# Altium footprint library Horizont_11_12_2017.PcbLib: 257 footprints (part 12 of 17)
Each footprint in its own frame and in the unit in brackets; x right, y up, seen from the top. Pads: shape width x height; smd on the part's side, far side on the other; paste and mask are expansions set on the pad; w line width, h text height; cw(c..) or ccw(c..) is an arc to the next point about the centre after c.
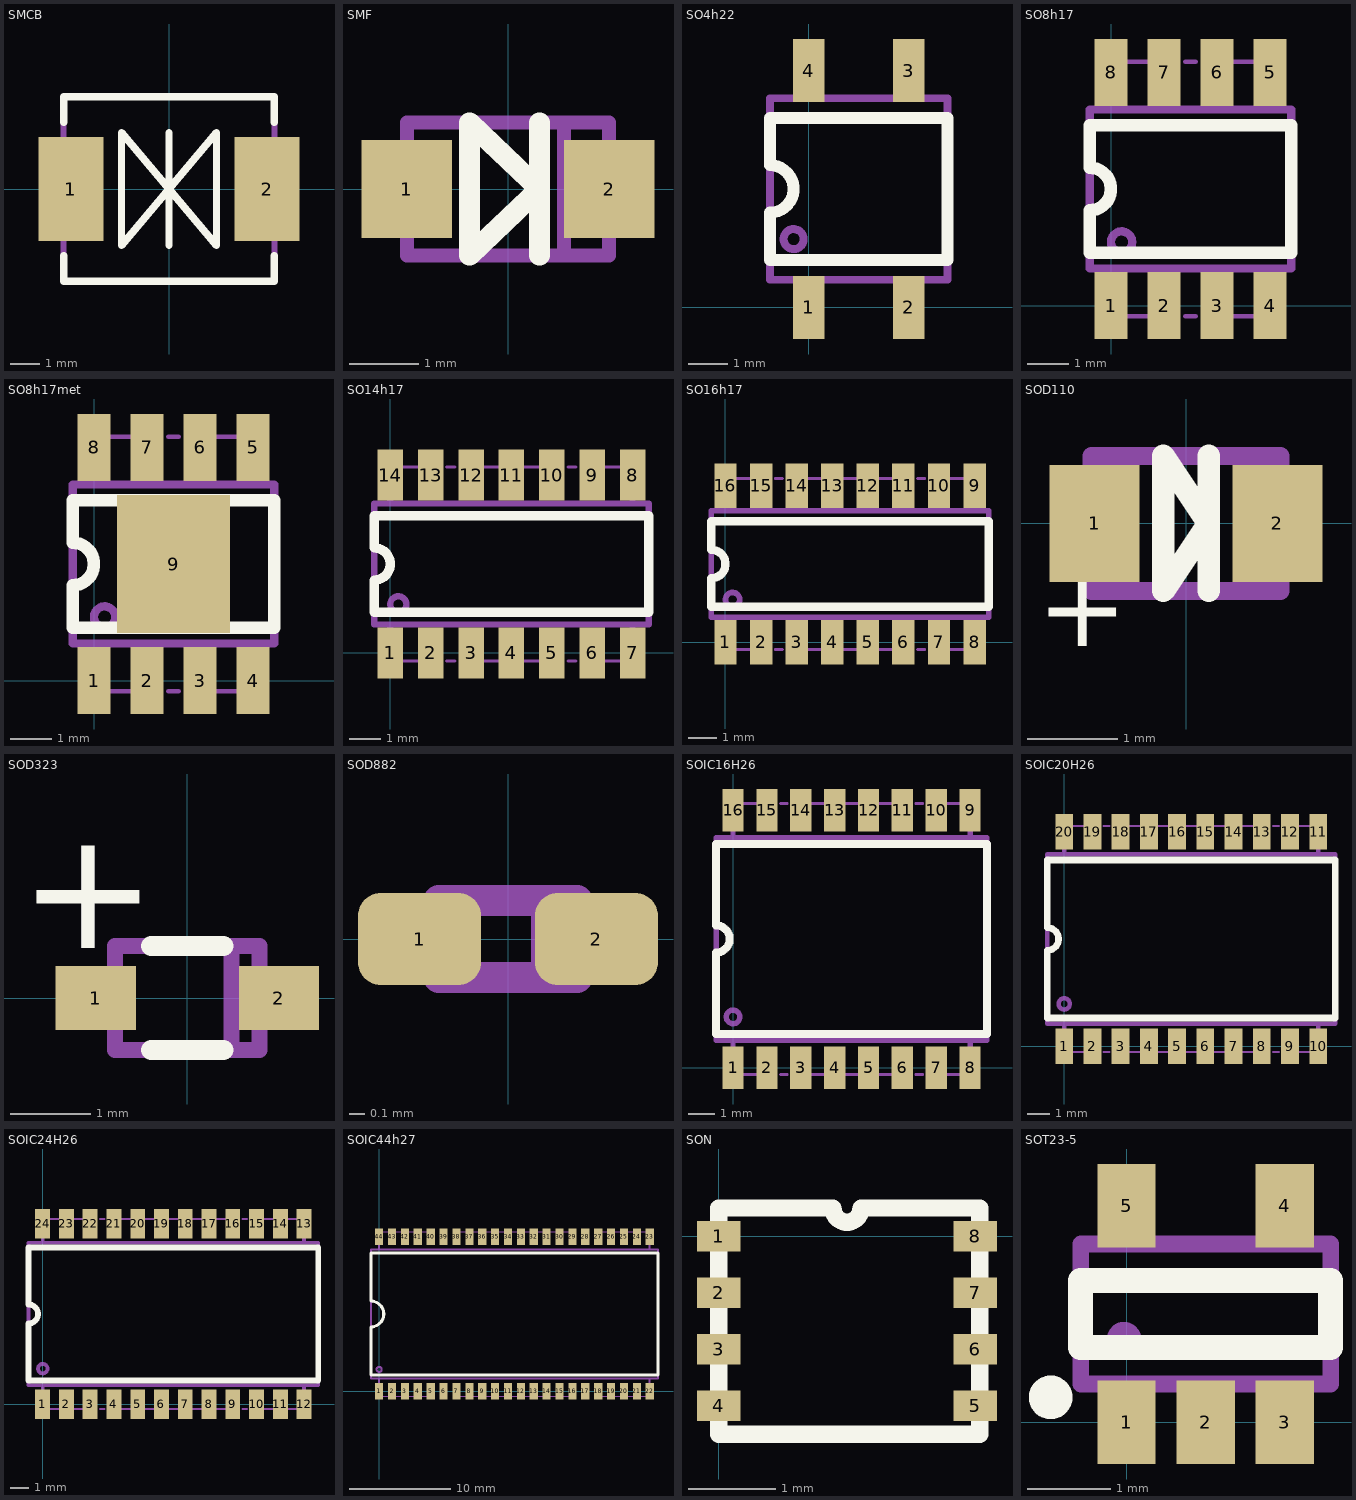
[diagram p11: the footprints below, top view; thin cyan lines are the x and y axes]

## SMCB [mm]
height 2.62
pads (2):
  rect 2.2x3.5 smd: 1(-3.3,0) 2(3.3,0)
Top Overlay:
  lines w0.25: -3.55,-2.25 -3.55,-3.1 3.55,-3.1 3.55,-2.25 ; -3.55,2.25 -3.55,3.1 3.55,3.1 3.55,2.25 ; 0,-1.9 0,1.9 ; 0,0 -1.6,-1.9 -1.6,1.9 0,0 ; 0,0 1.6,1.9 1.6,-1.9 0,0
Mechanical 1:
  lines w0.2: -3.55,-1.55 -4.05,-1.55 -4.05,1.55 -3.55,1.55 ; 3.55,-1.55 4.05,-1.55 4.05,1.55 3.55,1.55 ; -3.55,-3.1 3.55,-3.1 3.55,3.1 -3.55,3.1 -3.55,-3.1
  text "+" at -1.988,0.008 h1.5
  text ".Designator" at -0.748,0.128 h1.5
3D body "SMC.stp": height 2.62, standoff 0, extent -4.05,-3.1 4.08,3.12

## SMF [mm]
height 1.08
pads (2):
  rect 1.3x1.4 smd: 1(-1.45,0) 2(1.45,0)
Top Overlay:
  lines w0.3: 0.45,-0.95 0.45,0.95 ; -0.55,-0.95 0.45,0 -0.55,0.95 -0.55,-0.95
Mechanical 1:
  lines w0.2: -1.45,-0.6 -1.95,-0.6 -1.95,0.6 -1.45,0.6 ; 0.8,-0.95 0.8,0.95 ; 1.45,-0.6 1.95,-0.6 1.95,0.6 1.45,0.6 ; -1.45,-0.95 -1.45,0.95 1.45,0.95 1.45,-0.95 -1.45,-0.95
  text ".Designator" at -1.3,1.8 h1.5
  text "+" at -1.25,-0.55 h1.5
3D body "SMF.stp": height 1, standoff 0, extent -1.95,-0.95 1.95,0.95

## SO4h22 [mm]
height 2.2
pads (4):
  rect 0.8x1.6 smd: 1(0,0) 2(2.54,0) 3(2.54,6) 4(0,6)
Top Overlay:
  lines w0.3: -0.98,2.402 ccw(c-0.98,3.001) -0.98,3.6 -0.98,4.8 3.52,4.8 3.52,1.2 -0.98,1.2 -0.98,2.405
Mechanical 1:
  circle w0.2: c-0.381,1.73 r0.254
  lines w0.2: 0,-0.375 0,0.7 ; 0,5.3 0,6.375 ; 2.54,-0.375 2.54,0.7 ; 2.54,5.3 2.54,6.375 ; -0.98,0.7 3.52,0.7 3.52,5.3 -0.98,5.3 -0.98,0.7
  text "4" at -0.485,3.656 h1.5
  text ".Comment" at -1.51,-1.79 h1.5
  text ".Designator" at 0.34,2.26 h1.5
3D body "SO4h22.stp": height 2.21, standoff 0, extent -0.975,-0.4 3.525,6.4

## SO8h17 [mm]
height 1.7
pads (8):
  rect 0.8x1.6 smd: 1(0,0) 2(1.27,0) 3(2.54,0) 4(3.81,0) 5(3.81,5.588) 6(2.54,5.588) 7(1.27,5.588) 8(0,5.588)
Top Overlay:
  lines w0.3: -0.508,1.27 -0.508,2.286 ccw(c-0.508,2.794) -0.508,3.302 -0.508,4.318 4.318,4.318 4.318,1.27 -0.508,1.27
Mechanical 1:
  circle w0.2: c0.254,1.524 r0.254
  lines w0.1: 0,-0.254 1.27,-0.254 ; 0,5.842 1.27,5.842 ; 1.778,-0.254 2.032,-0.254 ; 1.778,5.842 2.032,5.842 ; 2.54,-0.254 3.81,-0.254 ; 2.54,5.842 3.81,5.842
  lines w0.2: 0,-0.254 0,0.762 ; 0,4.826 0,5.842 ; 3.81,-0.254 3.81,0.762 ; 3.81,4.826 3.81,5.842 ; -0.508,0.889 -0.508,4.699 4.318,4.699 4.318,0.889 -0.508,0.889
  text "8" at 0.15,3.45 h1.5
  text ".Comment" at -0.98,-1.79 h1.5
  text ".Designator" at 0.84,2.23 h1.5
3D body "SO8h17.stp": height 1.71, standoff 0, extent -0.6,-0.35 4.4,5.95

## SO8h17met [mm]
height 1.7
pads (9):
  rect 0.8x1.6 smd: 1(0,0) 2(1.27,0) 3(2.54,0) 4(3.81,0) 5(3.81,5.588) 6(2.54,5.588) 7(1.27,5.588) 8(0,5.588)
  rect 2.7x3.3 smd: 9(1.905,2.794)
Top Overlay:
  lines w0.3: -0.508,1.27 4.318,1.27 4.318,4.318 -0.508,4.318 -0.508,3.302 cw(c-0.508,2.794) -0.508,2.286 -0.508,1.27
Mechanical 1:
  circle w0.2: c0.254,1.524 r0.254
  lines w0.1: 0,-0.254 1.27,-0.254 ; 0,5.842 1.27,5.842 ; 1.778,-0.254 2.032,-0.254 ; 1.778,5.842 2.032,5.842 ; 2.54,-0.254 3.81,-0.254 ; 2.54,5.842 3.81,5.842
  lines w0.2: 0,-0.254 0,0.762 ; 0,4.826 0,5.842 ; 3.81,-0.254 3.81,0.762 ; 3.81,4.826 3.81,5.842 ; -0.508,0.889 4.318,0.889 4.318,4.699 -0.508,4.699 -0.508,0.889
  text ".Designator" at 0.78,2.04 h1.5
  text ".Comment" at -1.08,-1.6 h1.5
  text "8" at 0.15,3.45 h1.5
3D body "SO8h17.stp": height 1.71, standoff 0, extent -0.6,-0.35 4.4,5.95

## SO14h17 [mm]
height 1.7
pads (14):
  rect 0.8x1.6 smd: 1(0,0) 2(1.27,0) 3(2.54,0) 4(3.81,0) 5(5.08,0) 6(6.35,0) 7(7.62,0) 8(7.62,5.588) 9(6.35,5.588) 10(5.08,5.588) 11(3.81,5.588) 12(2.54,5.588) 13(1.27,5.588) 14(0,5.588)
Top Overlay:
  lines w0.3: -0.508,1.27 -0.508,2.286 ccw(c-0.508,2.794) -0.508,3.302 -0.508,4.318 8.128,4.318 8.128,1.27 -0.508,1.27
Mechanical 1:
  circle w0.2: c0.254,1.524 r0.254
  lines w0.1: 0,-0.254 1.27,-0.254 ; 0,5.842 1.27,5.842 ; 1.778,-0.254 2.032,-0.254 ; 1.778,5.842 2.032,5.842 ; 2.54,-0.254 5.08,-0.254 ; 2.54,5.842 5.08,5.842 ; 5.588,-0.254 5.842,-0.254 ; 5.588,5.842 5.842,5.842 ; 6.35,-0.254 7.62,-0.254 ; 6.35,5.842 7.62,5.842
  lines w0.2: 0,-0.254 0,0.762 ; 0,4.826 0,5.842 ; 7.62,-0.254 7.62,0.762 ; 7.62,4.826 7.62,5.842 ; -0.508,0.889 -0.508,4.699 8.128,4.699 8.128,0.889 -0.508,0.889
  text "14" at 0.01,3.4 h1.5
  text ".Comment" at 0.97,2.06 h1.5
  text ".Designator" at 2.05,3.48 h1.5
3D body "SO14h17.stp": height 1.71, standoff 0, extent -0.6,-0.35 8.21,5.95

## SO16h17 [mm]
height 1.7
pads (16):
  rect 0.8x1.6 smd: 1(0,0) 2(1.27,0) 3(2.54,0) 4(3.81,0) 5(5.08,0) 6(6.35,0) 7(7.62,0) 8(8.89,0) 9(8.89,5.588) 10(7.62,5.588) 11(6.35,5.588) 12(5.08,5.588) 13(3.81,5.588) 14(2.54,5.588) 15(1.27,5.588) 16(0,5.588)
Top Overlay:
  lines w0.3: -0.508,1.27 -0.508,2.286 ccw(c-0.508,2.794) -0.508,3.302 -0.508,4.318 9.398,4.318 9.398,1.27 -0.508,1.27
Mechanical 1:
  circle w0.2: c0.254,1.524 r0.254
  lines w0.1: 0,-0.254 1.27,-0.254 ; 0,5.842 1.27,5.842 ; 1.778,-0.254 2.032,-0.254 ; 1.778,5.842 2.032,5.842 ; 2.54,-0.254 6.35,-0.254 ; 2.54,5.842 6.35,5.842 ; 6.858,-0.254 7.112,-0.254 ; 6.858,5.842 7.112,5.842 ; 7.62,-0.254 8.89,-0.254 ; 7.62,5.842 8.89,5.842
  lines w0.2: 0,-0.254 0,0.762 ; 0,4.826 0,5.842 ; 8.89,-0.254 8.89,0.762 ; 8.89,4.826 8.89,5.842 ; -0.508,0.889 -0.508,4.699 9.398,4.699 9.398,0.889 -0.508,0.889
  text "16" at -0.127,3.556 h1.5
  text ".Designator" at 2.55,3.18 h1.5
  text ".Comment" at 1.47,1.76 h1.5
3D body "SO16h17.stp": height 1.71, standoff 0, extent -0.595,-0.356 9.485,5.944

## SOD110 [mm]
pads (2):
  rect 1x1.3 smd: 1(-1.016,0) 2(1.016,0)
Top Overlay:
  lines w0.25: -0.25,-0.75 0.25,0 -0.25,0.75 -0.25,-0.7 ; 0.25,-0.75 0.25,0.75
  text "+" at -1.651,-1.651 h1.5
Mechanical 1:
  lines w0.2: -1.05,-0.75 1.05,-0.75 1.05,0.75 -1.05,0.75 -1.05,-0.75
  text "+" at -0.9,-0.6 h1.5
  text ".Designator" at -0.975,1.223 h1.5
3D body "SOD110.stp": height 1.6, standoff 0, extent -1.1,-0.7 1.1,0.7

## SOD323 [mm]
height 1.1
pads (2):
  rect 1x0.8 smd: 1(-1.143,0) 2(1.143,0)
Top Overlay:
  lines w0.25: -0.45,-0.65 0.45,-0.65 ; -0.45,0.65 0.45,0.65
  text "+" at -2.1,0.625 h1.5
Mechanical 1:
  lines w0.2: -0.9,-0.2 -1.35,-0.2 -1.35,0.2 -0.9,0.2 ; 0.55,-0.65 0.55,0.65 ; 0.905,-0.2 1.35,-0.2 1.35,0.2 0.905,0.2 ; -0.9,-0.65 0.9,-0.65 0.9,0.65 -0.9,0.65 -0.9,-0.65
  text ".Designator" at 0.254,1.524 h1.5
  text "+" at -1.8,0.563 h1.5
3D body "SOD323.stp": height 1.1, standoff 0, extent -1.35,-0.675 1.35,0.675

## SOD882 [mm]
pads (2):
  rrect50% 0.8x0.6 smd: 1(-0.575,0) 2(0.575,0)
Mechanical 1:
  lines w0.2: 0.25,-0.25 0.25,0.25 ; -0.45,-0.25 -0.45,0.25 0.45,0.25 0.45,-0.25 -0.45,-0.25
  text ".Designator" at -0.721,0.724 h1.5
  text "+" at -0.975,-1.4 h1.5
3D body "SOD882.stp": height 0.5, standoff 0, extent -0.5,-0.3 0.52,0.32

## SOIC16H26 [mm]
height 2.6
pads (16):
  rect 0.8x1.6 smd: 1(0,0) 2(1.27,0) 3(2.54,0) 4(3.81,0) 5(5.08,0) 6(6.35,0) 7(7.62,0) 8(8.89,0) 9(8.89,9.652) 10(7.62,9.652) 11(6.35,9.652) 12(5.08,9.652) 13(3.81,9.652) 14(2.54,9.652) 15(1.27,9.652) 16(0,9.652)
Top Overlay:
  lines w0.3: -0.635,1.27 9.525,1.27 9.525,8.382 -0.635,8.382 -0.635,5.334 cw(c-0.635,4.826) -0.635,4.318 -0.635,1.27
Mechanical 1:
  circle w0.2: c0,1.905 r0.254
  lines w0.1: 0,-0.254 1.27,-0.254 ; 0,9.906 1.27,9.906 ; 1.778,-0.254 2.032,-0.254 ; 1.778,9.906 2.032,9.906 ; 2.54,-0.254 6.35,-0.254 ; 2.54,9.906 6.35,9.906 ; 6.858,-0.254 7.112,-0.254 ; 6.858,9.906 7.112,9.906 ; 7.62,-0.254 8.89,-0.254 ; 7.62,9.906 8.89,9.906
  lines w0.2: 0,-0.254 0,1.016 ; 0,8.636 0,9.906 ; 8.89,-0.254 8.89,1.016 ; 8.89,8.636 8.89,9.906 ; -0.635,1.016 9.525,1.016 9.525,8.636 -0.635,8.636 -0.635,1.016
  text ".Designator" at 2.78,5.28 h1.5
  text ".Comment" at 1.19,3.58 h1.5
  text "16" at 0,7 h1.5
3D body "SOIC16h26.stp": height 2.61, standoff 0, extent -0.8,-0.5 9.7,10.15

## SOIC20H26 [mm]
height 2.6
pads (20):
  rect 0.8x1.6 smd: 1(0,0) 2(1.27,0) 3(2.54,0) 4(3.81,0) 5(5.08,0) 6(6.35,0) 7(7.62,0) 8(8.89,0) 9(10.16,0) 10(11.43,0) 11(11.43,9.652) 12(10.16,9.652) 13(8.89,9.652) 14(7.62,9.652) 15(6.35,9.652) 16(5.08,9.652) 17(3.81,9.652) 18(2.54,9.652) 19(1.27,9.652) 20(0,9.652)
Top Overlay:
  lines w0.3: -0.76,1.27 -0.76,4.318 ccw(c-0.76,4.826) -0.76,5.334 -0.76,8.382 12.19,8.382 12.19,1.27 -0.76,1.27
Mechanical 1:
  circle w0.2: c0,1.905 r0.254
  lines w0.1: 0,-0.254 1.27,-0.254 ; 0,9.906 1.27,9.906 ; 1.778,-0.254 2.032,-0.254 ; 1.778,9.906 2.032,9.906 ; 2.54,-0.254 8.89,-0.254 ; 2.54,9.906 8.89,9.906 ; 9.398,-0.254 9.652,-0.254 ; 9.398,9.906 9.652,9.906 ; 10.16,-0.254 11.43,-0.254 ; 10.16,9.906 11.43,9.906
  lines w0.2: 0,-0.254 0,1.016 ; 0,8.636 0,9.906 ; 11.43,-0.254 11.43,1.016 ; 11.43,8.636 11.43,9.906 ; -0.76,1.016 -0.76,8.636 12.19,8.636 12.19,1.016 -0.76,1.016
  text "20" at 0,7 h1.5
  text ".Comment" at 2.865,3.58 h1.5
  text ".Designator" at 4.455,5.28 h1.5
3D body "SOIC20h26.stp": height 2.61, standoff 0, extent -0.76,-0.499 12.19,10.151

## SOIC24H26 [mm]
height 2.6
pads (24):
  rect 0.8x1.6 smd: 1(0,0) 2(1.27,0) 3(2.54,0) 4(3.81,0) 5(5.08,0) 6(6.35,0) 7(7.62,0) 8(8.89,0) 9(10.16,0) 10(11.43,0) 11(12.7,0) 12(13.97,0) 13(13.97,9.652) 14(12.7,9.652) 15(11.43,9.652) 16(10.16,9.652) 17(8.89,9.652) 18(7.62,9.652) 19(6.35,9.652) 20(5.08,9.652) 21(3.81,9.652) 22(2.54,9.652) 23(1.27,9.652) 24(0,9.652)
Top Overlay:
  lines w0.3: -0.76,1.27 14.73,1.27 14.73,8.382 -0.76,8.382 -0.76,5.334 cw(c-0.76,4.826) -0.76,4.318 -0.76,1.27
Mechanical 1:
  circle w0.2: c0,1.905 r0.254
  lines w0.1: 0,-0.254 2.54,-0.254 ; 0,9.906 2.54,9.906 ; 3.048,-0.254 3.302,-0.254 ; 3.048,9.906 3.302,9.906 ; 3.81,-0.254 10.16,-0.254 ; 3.81,9.906 10.16,9.906 ; 10.668,-0.254 10.922,-0.254 ; 10.668,9.906 10.922,9.906 ; 11.43,-0.254 13.97,-0.254 ; 11.43,9.906 13.97,9.906
  lines w0.2: 0,-0.254 0,1.016 ; 0,8.636 0,9.906 ; 13.97,-0.254 13.97,1.016 ; 13.97,8.636 13.97,9.906 ; -0.76,1.016 14.73,1.016 14.73,8.636 -0.76,8.636 -0.76,1.016
  text ".Designator" at 5.85,5.311 h1.5
  text ".Comment" at 3.88,3.605 h1.5
  text "24" at 0,7 h1.5
3D body "SOIC24h26.stp": height 2.61, standoff 0, extent -0.76,-0.499 14.73,10.151

## SOIC44h27 [mm]
height 2.7
pads (44):
  rect 0.8x1.6 smd: 1(0,0) 2(1.27,0) 3(2.54,0) 4(3.81,0) 5(5.08,0) 6(6.35,0) 7(7.62,0) 8(8.89,0) 9(10.16,0) 10(11.43,0) 11(12.7,0) 12(13.97,0) 13(15.24,0) 14(16.51,0) 15(17.78,0) 16(19.05,0) 17(20.32,0) 18(21.59,0) 19(22.86,0) 20(24.13,0) 21(25.4,0) 22(26.67,0) 23(26.67,15.24) 24(25.4,15.24) 25(24.13,15.24) 26(22.86,15.24) 27(21.59,15.24) 28(20.32,15.24) 29(19.05,15.24) 30(17.78,15.24) 31(16.51,15.24) 32(15.24,15.24) 33(13.97,15.24) 34(12.7,15.24) 35(11.43,15.24) 36(10.16,15.24) 37(8.89,15.24) 38(7.62,15.24) 39(6.35,15.24) 40(5.08,15.24) 41(3.81,15.24) 42(2.54,15.24) 43(1.27,15.24) 44(0,15.24)
Top Overlay:
  lines w0.3: -0.815,1.62 27.485,1.62 27.485,13.62 -0.815,13.62 -0.815,8.89 cw(c-0.815,7.62) -0.815,6.35 -0.815,1.62 ; -0.815,1.62 -0.77,1.62 -0.815,1.62
Mechanical 1:
  circle w0.2: c0,2.159 r0.254
  lines w0.1: 0,-0.508 5.08,-0.508 ; 0,15.748 5.08,15.748 ; 6.223,-0.508 6.477,-0.508 ; 6.223,15.748 6.477,15.748 ; 7.62,-0.508 19.05,-0.508 ; 7.62,15.748 19.05,15.748 ; 20.193,-0.508 20.447,-0.508 ; 20.193,15.748 20.447,15.748 ; 21.59,-0.508 26.67,-0.508 ; 21.59,15.748 26.67,15.748
  lines w0.2: 0,-0.508 0,1.28 ; 0,13.96 0,15.748 ; 26.67,-0.508 26.67,1.28 ; 26.67,13.96 26.67,15.748 ; -0.8,1.28 -0.8,13.96 27.47,13.96 27.47,1.28 -0.8,1.28
  text ".Comment" at 10.866,6.501 h1.5
  text ".Designator" at 12.456,8.201 h1.5
  text "44" at 0,12.446 h1.5
3D body "SOIC44h27.stp": height 2.71, standoff 0, extent -0.8,-0.53 27.47,15.77

## SON [mm]
pads (8):
  rect 0.5x0.35 smd: 1(0,0) 2(0,-0.65) 3(0,-1.3) 4(0,-1.95) 5(2.95,-1.95) 6(2.95,-1.3) 7(2.95,-0.65) 8(2.95,0)
Top Overlay:
  lines w0.2: 0,-2.275 0,0.325 1.312,0.325 ccw(c1.475,0.325) 1.637,0.325 3,0.325 3,-2.275 0,-2.275
3D body "User Library-DRB(S-PVSON-N8).STEP": height 1, standoff -0.05, extent -0.02,-2.515 3.02,0.525

## SOT23-5 [mm]
height 1.45
pads (5):
  rect 0.7x1 smd: 1(0,0) 2(0.95,0) 3(1.9,0) 4(1.9,2.6) 5(0,2.6)
Top Overlay:
  circle w0.3: c-0.912,0.3 r0.112
  lines w0.3: -0.55,0.9 2.45,0.9 2.45,1.7 -0.55,1.7 -0.55,0.9
Mechanical 1:
  circle w0.25: c-0.03,1 r0.08
  lines w0.2: 0,-0.2 0,0.45 ; 0,2.15 0,2.8 ; 1.9,-0.2 1.9,0.46 ; 1.9,2.15 1.9,2.8 ; -0.55,0.46 -0.55,2.14 2.45,2.14 2.45,0.46 -0.55,0.46 ; 0.95,-0.2 0.95,0.45 0.95,-0.2
  text "5" at -1.1,2.35 h1.5
  text ".Comment" at -1.72,-1.44 h1.5
  text ".Designator" at -0.02,3.16 h1.5
3D body "R-PDSO-G5.stp": height 1.46, standoff 0, extent -0.5,-0.2 2.4,2.8